# Altium footprint library My_PCB_6_28.PcbLib: 151 footprints (part 2 of 10)
Each footprint in its own frame and in the unit in brackets; x right, y up, seen from the top. Pads: shape width x height; smd on the part's side, far side on the other; paste and mask are expansions set on the pad; w line width, h text height; cw(c..) or ccw(c..) is an arc to the next point about the centre after c.
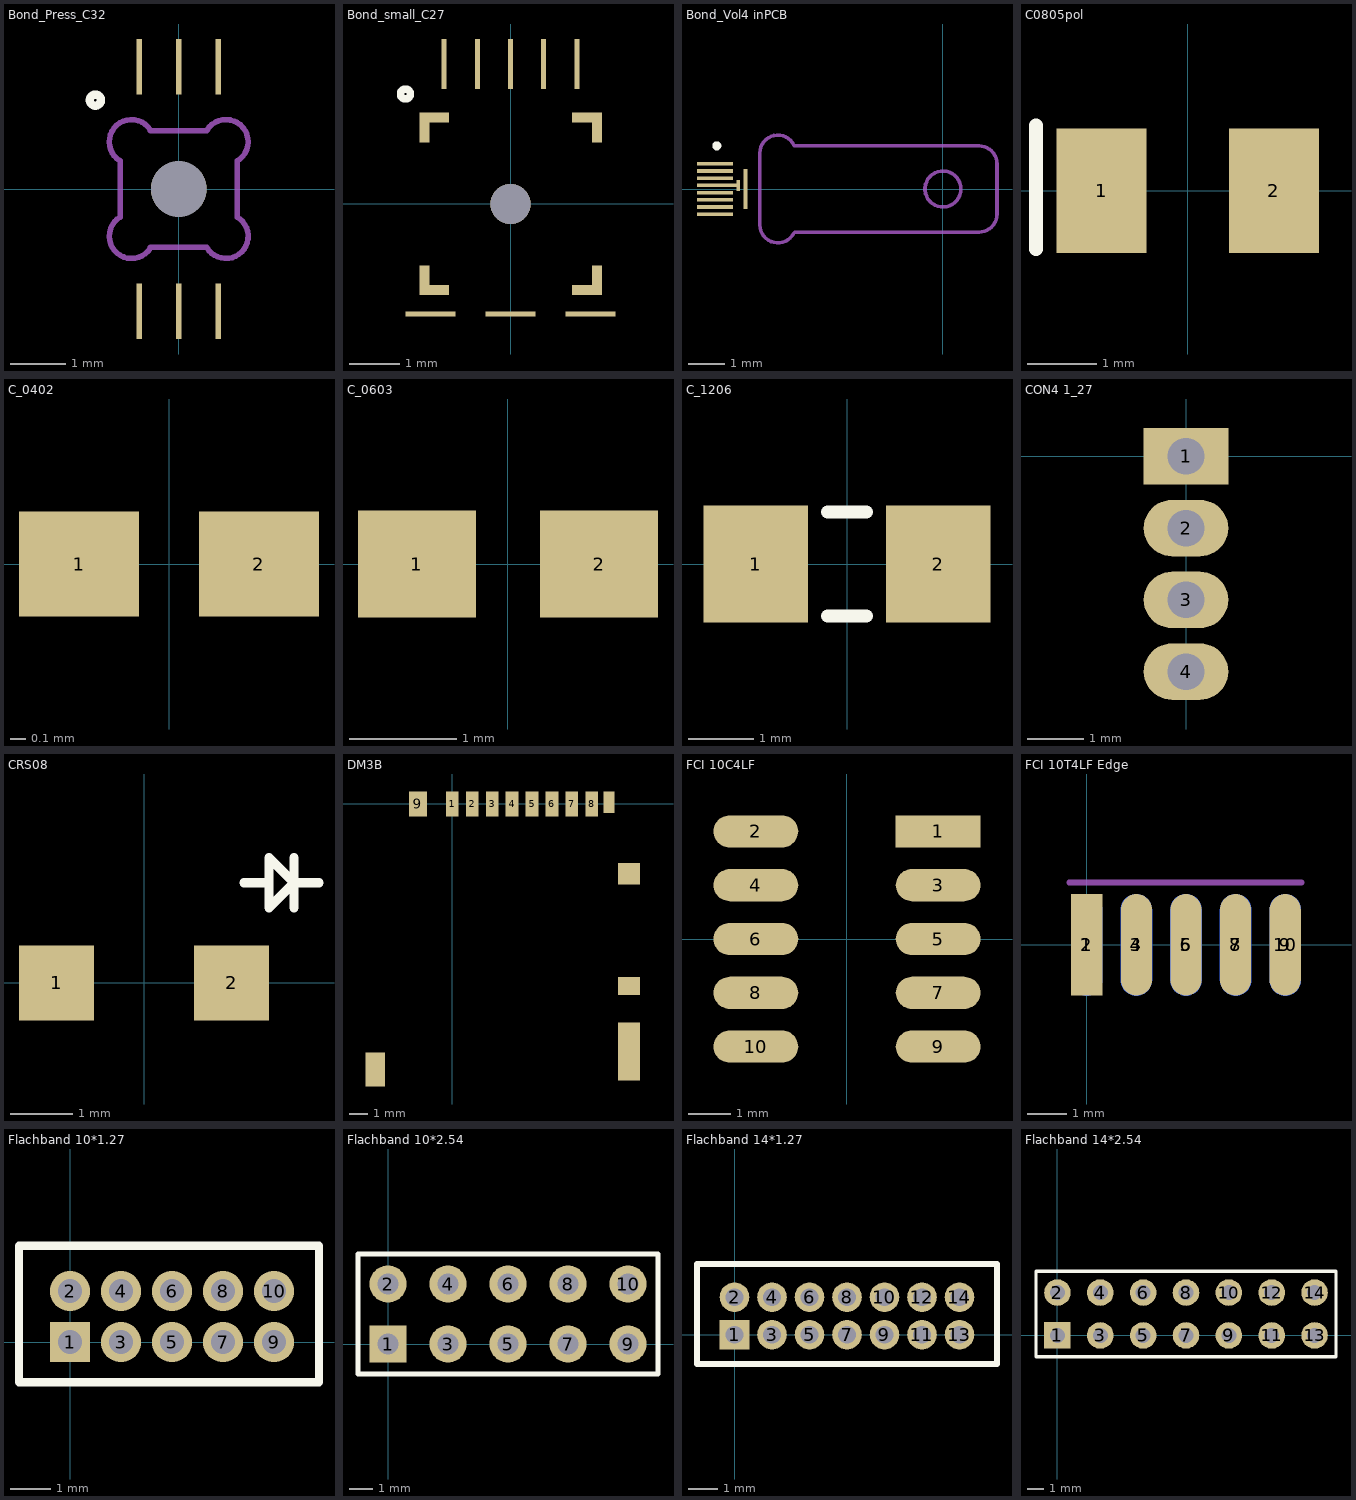
[diagram p1: the footprints below, top view; thin cyan lines are the x and y axes]

## Bond_Press_C32 [mm] "Drucksensor 1,65*1,65mm"
pads (7):
  rect 0.1x1 smd paste-1: 1(-0.713,2.2) 2(0,2.2) 3(0.713,2.2) 4(0.713,-2.2) 5(0,-2.2) 6(-0.713,-2.2)
  round 1 hole 1 paste-1 mask+0.102: ""(0,0)
Top Overlay:
  circle w0.15: c-1.5,1.6 r0.1
Mechanical 2:
  lines w0.1: -1.056,-0.507 ccw(c-0.85,-0.85) -0.511,-1.062 ; -1.05,-0.508 -1.05,0.508 ; -1.05,0.504 cw(c-0.85,0.85) -0.515,1.068 ; -0.508,-1.05 0.508,-1.05 ; -0.508,1.05 0.508,1.05 ; 0.504,-1.05 ccw(c0.85,-0.85) 1.05,-0.504 ; 0.511,1.062 cw(c0.85,0.85) 1.05,0.504 ; 1.05,-0.508 1.05,0.508

## Bond_small_C27 [mm] "Drucksensor 3,05*3,05mm"
pads (17):
  rect 0.1x1 smd paste-1: 1(-1.325,2.8) 2(-0.66,2.8) 3(0,2.8) 4(0.66,2.8) 5(1.325,2.8)
  rect 1x0.1 smd paste-1: 6(1.6,-2.2) 7(0,-2.2) 8(-1.6,-2.2)
  rect 0.2x0.6 smd paste-1: ""(-1.725,-1.525) ""(-1.725,1.525) ""(1.725,-1.525) ""(1.725,1.525)
  rect 0.6x0.2 smd paste-1: ""(-1.525,-1.725) ""(-1.525,1.725) ""(1.525,-1.725) ""(1.525,1.725)
  round 0.8 hole 0.8 paste-1 mask+0.102: ""(0,0)
Top Overlay:
  circle w0.15: c-2.1,2.2 r0.1

## Bond_Vol4 inPCB [mm] "Chip in PCB-Tasche buendig einkleben"
pads (10):
  rect 1x0.1 smd paste-1: 1(-6.345,0.7) 2(-6.345,0.5) 3(-6.345,0.3) 5(-6.345,-0.1) 6(-6.345,-0.3) 7(-6.345,-0.5) 8(-6.345,-0.7)
  rect 1.2x0.1 smd paste-1: 4(-6.245,0.1)
  rect 0.1x1.1 smd paste-1: Bar(-5.495,0)
  rect 0.1x0.3 smd paste-1: T(-5.695,0.1)
Top Overlay:
  circle w0.15: c-6.295,1.2 r0.05
Mechanical 13:
  lines w0.1: -4.149,-1.227 cw(c-4.595,-1) -5.095,-1 -5.095,1 cw(c-4.595,1) -4.142,1.211 ; -4.12,-1.2 1.005,-1.2 ccw(c1.005,-0.7) 1.505,-0.7 1.505,0.7 ccw(c1.005,0.7) 1.005,1.2 -4.12,1.2
Mechanical 15:
  circle w0.1: c0,0 r0.5

## C0805pol [mm] "Elko"
height 0.7
pads (2):
  rect 1.3x1.8 smd: 1(-1.25,0) 2(1.25,0)
Top Overlay:
  lines w0.2: -2.2,-0.85 -2.2,0.95
3D body: height 0.79, standoff 0.01, extent -1.6,-0.8 1.6,0.8

## C_0402 [mm] "Chip Resistor; Body 1 x 0.5 mm (LxW typ)"
height 0.4
pads (2):
  rect 0.8x0.7 smd: 1(-0.6,0) 2(0.6,0)
3D body: height 0.36, standoff 0, extent -0.5,-0.265 0.5,0.265

## C_0603 [mm] "Chip Resistor; Body 1.6 x 0.9 mm (LxW typ)"
height 0.55
pads (2):
  rect 1.1x1 smd: 1(-0.85,0) 2(0.85,0)
3D body: height 0.8, standoff 0, extent -0.8,-0.4 0.8,0.4

## C_1206 [mm] "Chip Resistor; Body 3.1 x 1.6 mm (LxW typ)"
pads (2):
  rect 1.6x1.8 smd: 1(-1.4,0) 2(1.4,0)
Top Overlay:
  lines w0.2: -0.3,-0.8 0.3,-0.8 ; -0.3,0.8 0.3,0.8
3D body: height 0.77, standoff -0.01, extent -1.6,-0.8 1.6,0.8

## CON4 1_27 [mm]
pads (4):
  rect 1.5x1 hole 0.65: 1(0,0)
  oval 1.5x1 hole 0.65: 2(0,-1.27) 3(0,-2.54) 4(0,-3.81)

## CRS08 [mm]
pads (2):
  rect 1.2x1.2 smd: 1(-1.4,0) 2(1.4,0)
Top Overlay:
  lines w0.15: 1.6,1.6 2,1.6 ; 2.4,1.2 2.4,2 ; 2.8,1.6 2.4,1.6 ; 2.4,1.6 2,1.2 2,2 2.4,1.6
3D body: height 1.27, standoff 0, extent -1.85,-0.8 1.85,0.8

## DM3B [mm]
height 2
pads (14):
  rect 0.7x1.4 smd: 1(0,0) 2(1.1,0) 3(2.2,0) 4(3.3,0) 5(4.4,0) 6(5.5,0) 7(6.6,0) 8(7.7,0)
  rect 1x1.4 smd: 9(-1.9,0)
  rect 1.1x1.9 smd: ""(-4.25,-14.65)
  rect 0.6x1.2 smd: ""(8.65,0.1)
  rect 1.2x3.2 smd: ""(9.75,-13.65)
  rect 1.2x1 smd: ""(9.75,-10.05)
  rect 1.2x1.2 smd: ""(9.75,-3.85)
3D body: height 1.9, standoff 0.07, extent -4.15,-16.975 9.7,0.575

## FCI 10C4LF [mm]
pads (10):
  rect 2x0.76 smd: 1(2.15,2.54)
  oval 2x0.76 smd: 2(-2.15,2.54) 3(2.15,1.27) 4(-2.15,1.27) 5(2.15,0) 6(-2.15,0) 7(2.15,-1.27) 8(-2.15,-1.27) 9(2.15,-2.54) 10(-2.15,-2.54)
3D body: height 4.5, standoff 0, extent -2.75,-3.145 2.75,3.205

## FCI 10T4LF Edge [mm]
pads (10):
  rect 0.8x2.6 smd: 1(0,0)
  oval 0.8x2.6 smd far side: 2(0,0) 4(1.27,0) 6(2.54,0) 8(3.81,0) 10(5.08,0)
  oval 0.8x2.6 smd: 3(1.27,0) 5(2.54,0) 7(3.81,0) 9(5.08,0)
Mechanical 1:
  lines w0.15: -0.45,1.6 5.5,1.6
3D body: height 0.92, standoff -2.08, extent -0.855,-1.05 5.955,5.65

## Flachband 10*1.27 [mm]
height 20
pads (10):
  rect 1x1 hole 0.6: 1(0,0)
  round 1 hole 0.6: 2(0,1.27) 3(1.27,0) 4(1.27,1.27) 5(2.54,0) 6(2.54,1.27) 7(3.81,0) 8(3.81,1.27) 9(5.08,0) 10(5.08,1.27)
Top Overlay:
  lines w0.203: -1.27,-1 6.2,-1 6.2,2.4 -1.27,2.4 -1.27,-1
  text "." at -1.4,-2.2 h1.27

## Flachband 10*2.54 [mil]
height 787.4
pads (10):
  rect 62x62 hole 35: 1(0,0)
  round 62 hole 35: 2(0,100) 3(100,0) 4(100,100) 5(200,0) 6(200,100) 7(300,0) 8(300,100) 9(400,0) 10(400,100)
Top Overlay:
  lines w8: -50,-50 -50,150 450,150 450,-50 -50,-50
  text "." at -55.12,-86.61 h50

## Flachband 14*1.27 [mm]
height 12
pads (14):
  rect 1x1 hole 0.6: 1(0,0)
  round 1 hole 0.6: 2(0,1.27) 3(1.27,0) 4(1.27,1.27) 5(2.54,0) 6(2.54,1.27) 7(3.81,0) 8(3.81,1.27) 9(5.08,0) 10(5.08,1.27) 11(6.35,0) 12(6.35,1.27) 13(7.62,0) 14(7.62,1.27)
Top Overlay:
  lines w0.203: -1.27,-1 -1.27,2.4 8.89,2.4 8.89,-1 -1.27,-1
  text "." at -1.4,-2.2 h1.27

## Flachband 14*2.54 [mil]
height 787.4
pads (14):
  rect 62x62 hole 35: 1(0,0)
  round 62 hole 35: 2(0,100) 3(100,0) 4(100,100) 5(200,0) 6(200,100) 7(300,0) 8(300,100) 9(400,0) 10(400,100) 11(500,0) 12(500,100) 13(600,0) 14(600,100)
Top Overlay:
  lines w8: -50,-50 -50,150 650,150 650,-50 -50,-50
  text "." at -39.37,-86.61 h50